# Altium footprint library myLibraryAltium.PcbLib: 215 footprints (part 9 of 14)
Each footprint in its own frame and in the unit in brackets; x right, y up, seen from the top. Pads: shape width x height; smd on the part's side, far side on the other; paste and mask are expansions set on the pad; w line width, h text height; cw(c..) or ccw(c..) is an arc to the next point about the centre after c.
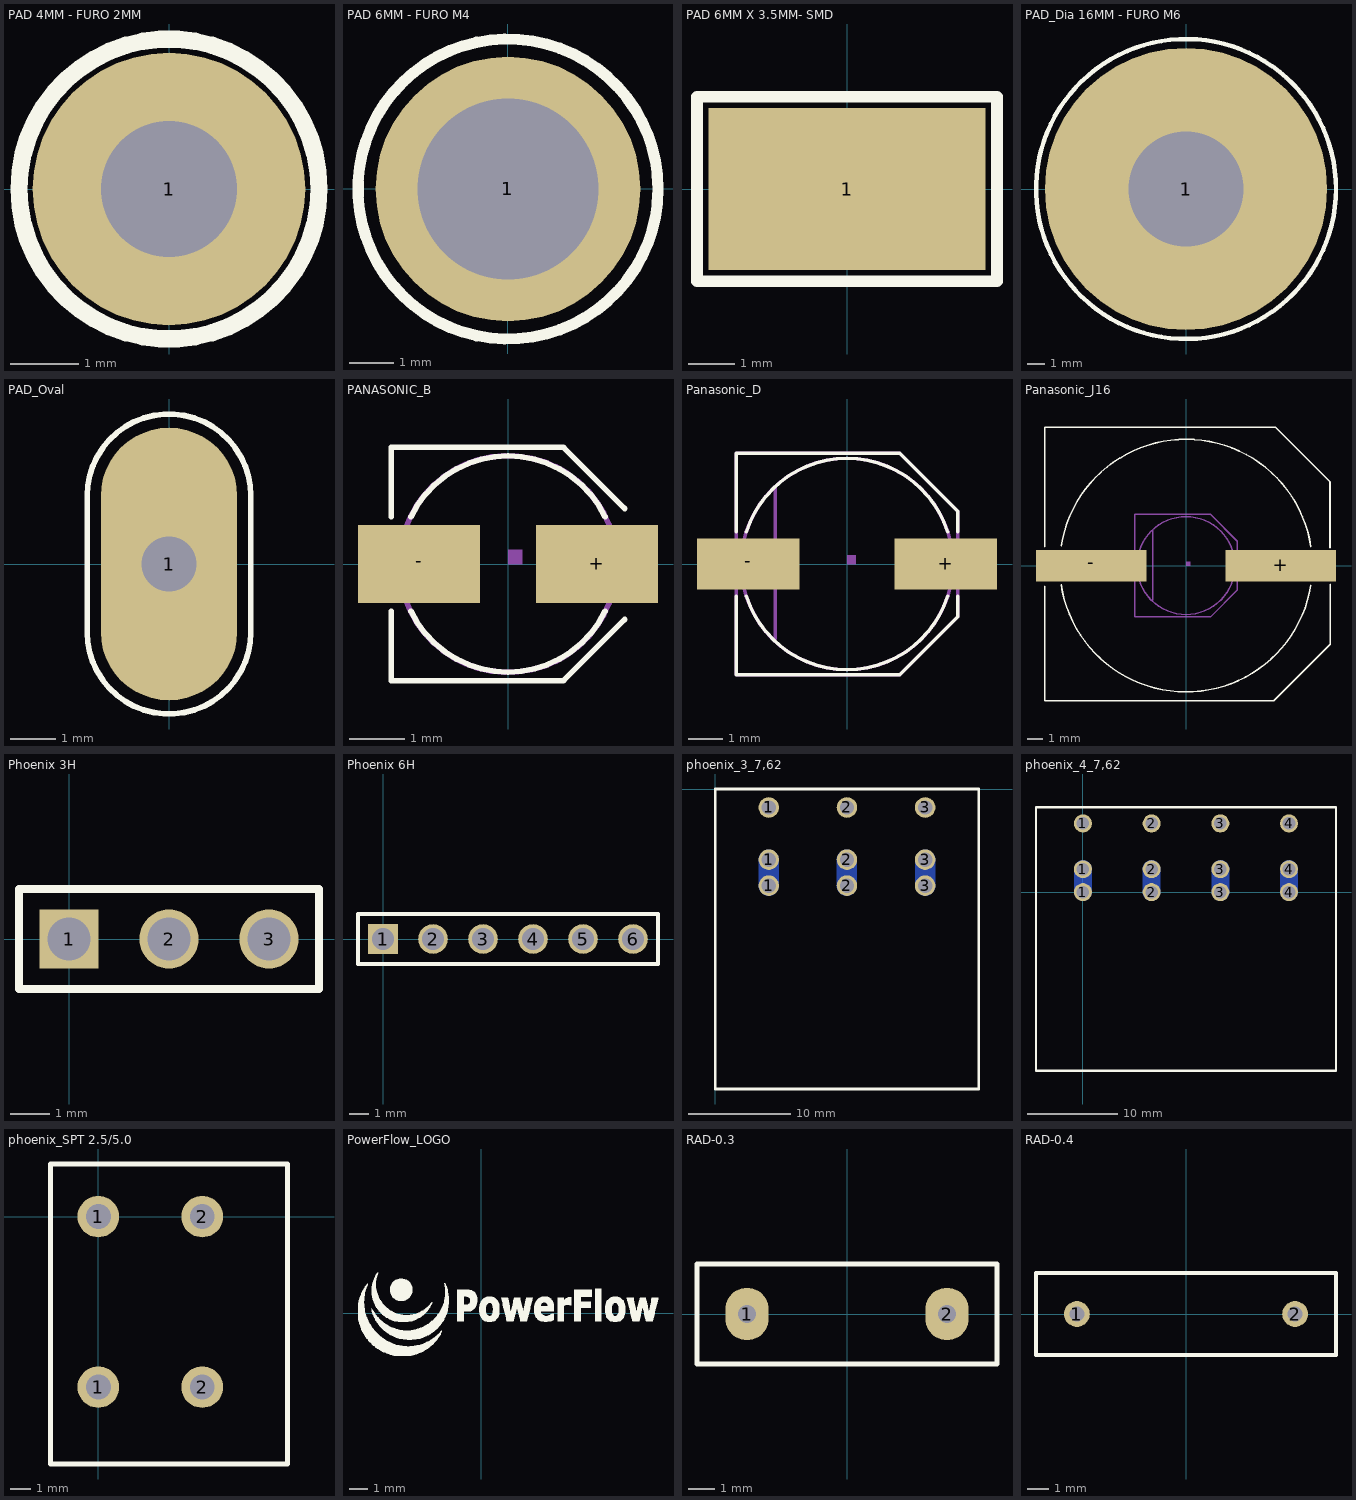
[diagram p8: the footprints below, top view; thin cyan lines are the x and y axes]

## PAD 4MM - FURO 2MM [mm]
pads (1):
  round 4 hole 2: 1(0,0)
Top Overlay:
  circle w0.254: c0,0 r2.2

## PAD 6MM - FURO M4 [mm]
pads (1):
  round 6 hole 4.11: 1(0,0)
Top Overlay:
  circle w0.254: c0,0 r3.4

## PAD 6MM X 3.5MM- SMD [mm]
pads (1):
  rect 6x3.5 smd: 1(0,0)
Top Overlay:
  lines w0.254: -3.25,-2 -3.25,2 3.25,2 3.25,-2 -3.25,-2

## PAD_Dia 16MM - FURO M6 [mm]
pads (1):
  round 16 hole 6.5: 1(0,0)
Top Overlay:
  circle w0.254: c0,0 r8.5

## PAD_Oval [mm] "3x6mm - 1,2x4,2 Hole"
pads (1):
  oval 3x6 hole 1.2 square: 1(0,0)
Top Overlay:
  lines w0.127: -1.8,-1.5 ccw(c0,-1.5) 1.8,-1.5 1.8,1.5 ccw(c0,1.5) -1.8,1.5 -1.8,-1.5

## PANASONIC_B [mm]
pads (2):
  rect 2.2x1.4 smd: +(1.6,0) -(-1.6,0)
Top Overlay:
  lines w0.102: -2.1,-0.85 -2.1,-2.1 1,-2.1 2.1,-1 ; -2.1,0.85 -2.1,2.1 1,2.1 2.1,1 ; -1.75,-0.85 ccw(c0,0) 1.75,-0.85 ; -1.75,0.85 cw(c0,0) 1.75,0.85
Mechanical 18:
  circle w0.102: c0,0 r1.95
  rectangle: -2.3,-0.35 -1.85,0.35
  rectangle: 1.9,-0.35 2.3,0.35
  region: 0,0 0.254,0 0.254,0.254 0,0.254
3D body "User Library-ALU-B.STEP": height 5.4, standoff 0, extent -2.3,-2.15 2.3,2.15

## Panasonic_D [mm]
pads (2):
  rect 3x1.5 smd: +(2.9,0) -(-2.9,0)
Top Overlay:
  lines w0.102: -3.25,-0.95 -3.25,-3.25 1.55,-3.25 3.25,-1.55 3.25,-0.95 ; -3.25,0.95 -3.25,3.25 1.55,3.25 3.25,1.55 3.25,0.95 ; -2.95,-0.95 ccw(c0,0) 2.95,-0.95 ; -2.95,0.95 cw(c0,0) 2.95,0.95
Mechanical 18:
  circle w0.102: c0,0 r3.1
  rectangle: -3.65,-0.35 -3.05,0.35
  rectangle: 3.05,-0.35 3.65,0.35
  region: 0,0 0.254,0 0.254,0.254 0,0.254
  lines w0.102: -2.1,-2.2 -2.1,2.25 ; -3.25,-3.25 1.55,-3.25 3.25,-1.55 3.25,1.55 1.55,3.25 -3.25,3.25 -3.25,-3.25
3D body "User Library-6_3x7_7.STEP": height 8, standoff 0, extent -3.8,-3.3 3.8,3.3

## Panasonic_J16 [mm]
pads (2):
  rect 7x2 smd: +(6,0) -(-6,0)
Top Overlay:
  lines w0.102: -8.941,-1.295 -8.941,-8.56 5.563,-8.56 9.144,-4.978 9.144,-1.194 ; -8.941,1.194 -8.941,8.763 5.664,8.763 9.119,5.309 9.119,1.143 ; -7.909,-1.201 ccw(c0,0) 7.903,-1.245 ; -7.903,1.245 cw(c0,0) 7.909,1.201
Mechanical 18:
  circle w0.102: c0,0 r3.1
  rectangle: 3.05,-0.35 3.65,0.35
  rectangle: -3.65,-0.35 -3.05,0.35
  region: 0,0 0.254,0 0.254,0.254 0,0.254
  lines w0.102: -2.1,-2.2 -2.1,2.25 ; -3.25,-3.25 -3.25,3.25 1.55,3.25 3.25,1.55 3.25,-1.55 1.55,-3.25 -3.25,-3.25
3D body "User Library-capacitor size J16.step": height 16.5, standoff -0.01, extent -9.002,-8.525 8.698,8.475

## Phoenix 3H [mm] "Connector; Header; 3 Position"
pads (3):
  rect 1.5x1.5 hole 1.1: 1(0,0)
  round 1.5 hole 1.1: 2(2.54,0) 3(5.08,0)
Top Overlay:
  lines w0.2: -1.27,-1.27 -1.27,1.27 6.35,1.27 6.35,-1.27 -1.27,-1.27

## Phoenix 6H [mm] "Connector; Header; 6 Position"
pads (6):
  rect 1.5x1.5 hole 1.1: 1(0,0)
  round 1.5 hole 1.1: 2(2.54,0) 3(5.08,0) 4(7.62,0) 5(10.16,0) 6(12.7,0)
Top Overlay:
  lines w0.2: -1.27,-1.27 13.97,-1.27 13.97,1.27 -1.27,1.27 -1.27,-1.27

## phoenix_3_7,62 [mm]
pads (9):
  round 2 hole 1.4: 1(5.207,-9.423) 1(5.207,-6.883) 1(5.207,-1.803) 2(12.827,-9.423) 2(12.827,-6.883) 2(12.827,-1.803) 3(20.447,-9.423) 3(20.447,-6.883) 3(20.447,-1.803)
Bottom Layer:
  lines w2: 12.827,-9.423 12.827,-6.883 ; 20.447,-9.423 20.447,-6.883 ; 5.207,-9.423 5.207,-6.883 5.207,-9.423
Top Overlay:
  lines w0.254: 0,-29.25 25.66,-29.25 25.66,0 0,0 0,-29.25
3D body "37768.stp": height 14.62, standoff -4.59, extent 0.099,-29.301 25.759,-0.051

## phoenix_4_7,62 [mm]
pads (12):
  round 2 hole 1.4: 1(0,0) 1(0,2.54) 1(0,7.62) 2(7.62,0) 2(7.62,2.54) 2(7.62,7.62) 3(15.24,0) 3(15.24,2.54) 3(15.24,7.62) 4(22.86,0) 4(22.86,2.54) 4(22.86,7.62)
Bottom Layer:
  lines w2: 7.62,0 7.62,2.54 ; 15.24,0 15.24,2.54 ; 22.86,0 22.86,2.54 ; 0,0 0,2.54 0,0
Top Overlay:
  lines w0.254: 28.021,-19.827 -5.207,-19.827 -5.207,9.423 28.073,9.423 28.073,-19.827
3D body "62881.stp": height 14.62, standoff -4.59, extent -5.159,-19.812 28.121,9.438

## phoenix_SPT 2.5/5.0 [mm]
pads (4):
  round 2 hole 1.2: 1(0,-8.2) 1(0,0) 2(5,-8.2) 2(5,0)
Top Overlay:
  lines w0.254: -2.3,-11.9 9.1,-11.9 9.1,2.53 -2.3,2.53 -2.3,-11.9
3D body "1990973.stp": height 14.05, standoff -1.95, extent -2.4,-12 9,2.4

## PowerFlow_LOGO [mm] "16.5 x 6.5 mm"
Top Overlay:
  drawing of 1422 lines, arcs and shapes, not listed

## RAD-0.3 [mm] "Radial Cap, Thru-Hole; 2 Leads; 0.3 in Pin Spacing"
height 6
pads (2):
  oval 1.65x2 hole 0.7: 1(-3.81,0) 2(3.81,0)
Top Overlay:
  lines w0.2: -5.715,-1.905 -5.715,1.905 5.715,1.905 5.715,-1.905 -5.715,-1.905

## RAD-0.4 [mm] "Radial Cap, Thru-Hole; 2 Leads; 0.4 in Pin Spacing"
pads (2):
  round 1.2 hole 0.7: 1(-5.08,0) 2(5.08,0)
Top Overlay:
  lines w0.2: -6.985,-1.905 6.985,-1.905 6.985,1.905 -6.985,1.905 -6.985,-1.905